# Altium footprint library Terra.PcbLib: 59 footprints (part 3 of 4)
Each footprint in its own frame and in the unit in brackets; x right, y up, seen from the top. Pads: shape width x height; smd on the part's side, far side on the other; paste and mask are expansions set on the pad; w line width, h text height; cw(c..) or ccw(c..) is an arc to the next point about the centre after c.
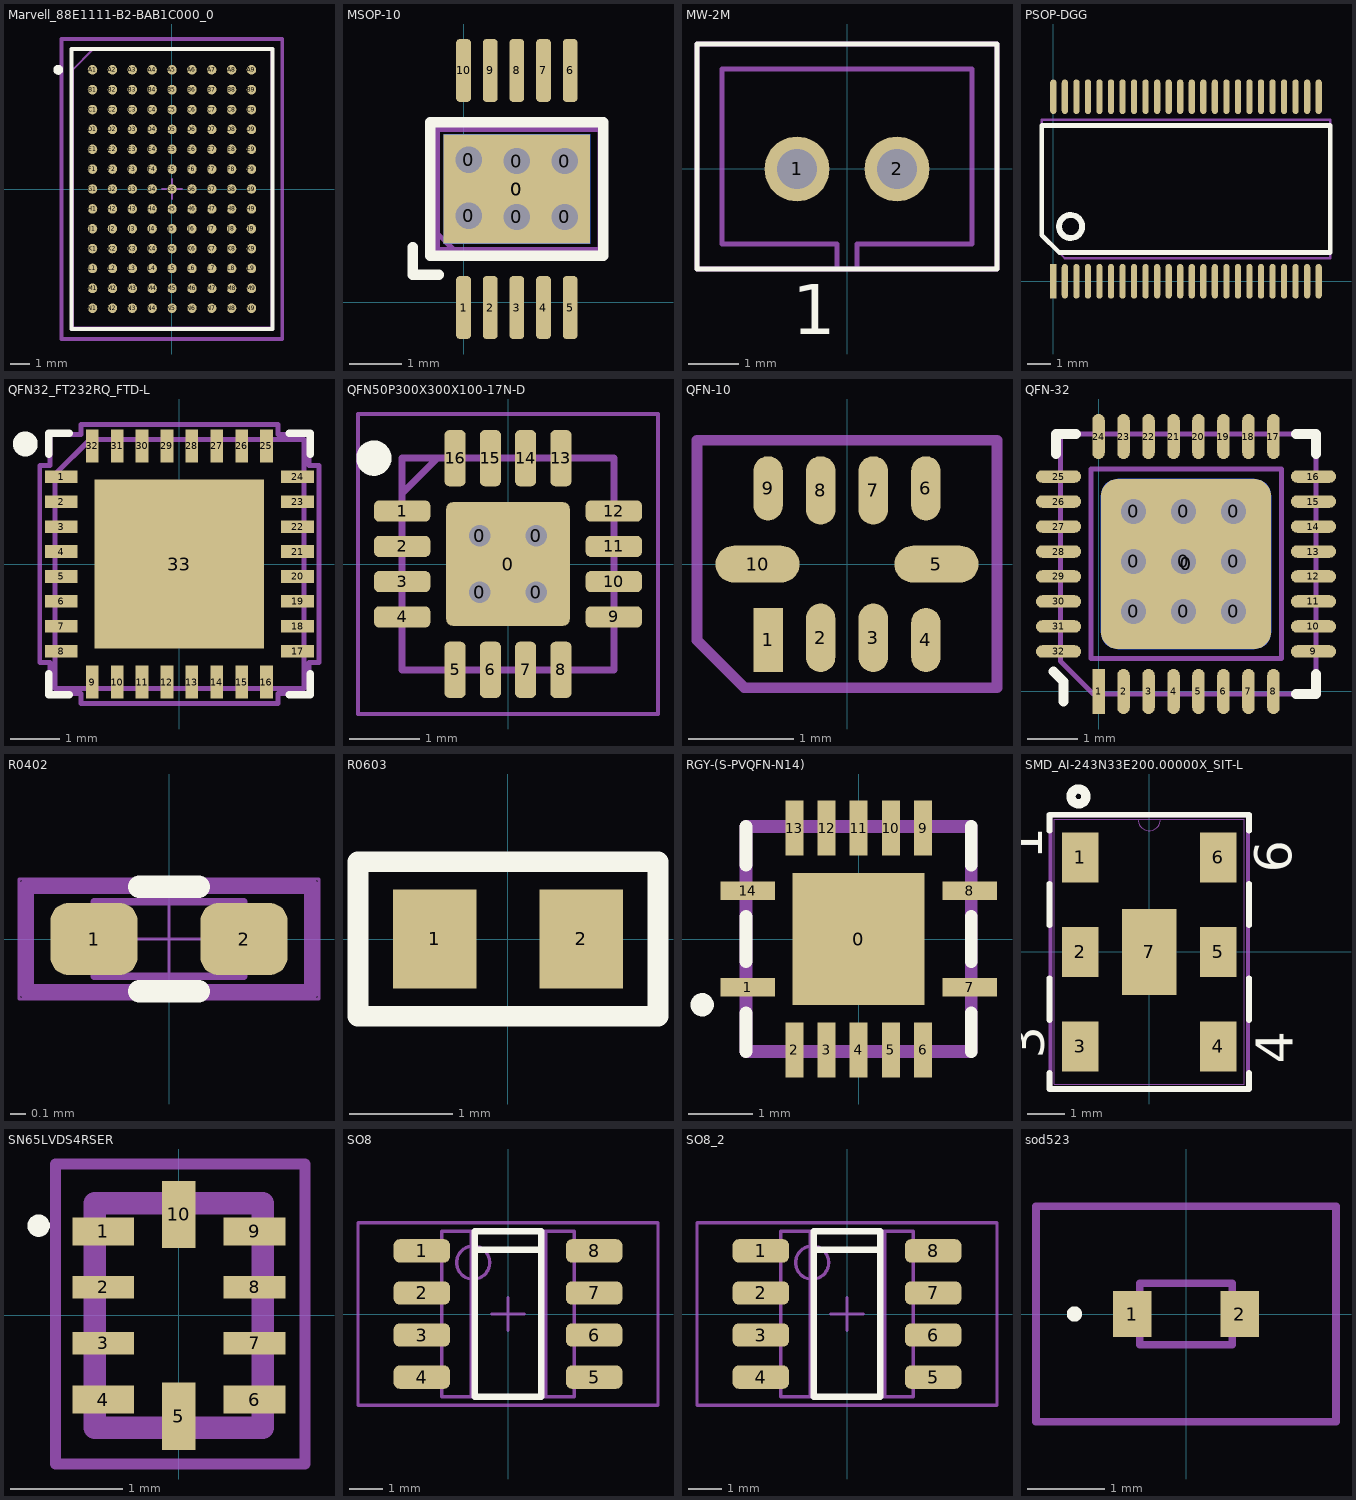
[diagram p2: the footprints below, top view; thin cyan lines are the x and y axes]

## Marvell_88E1111-B2-BAB1C000_0 [mm]
pads (117):
  round 0.48 smd paste+0 mask+0: A1(-4,6) A2(-3,6) A3(-2,6) A4(-1,6) A5(0,6) A6(1,6) A7(2,6) A8(3,6) A9(4,6) B1(-4,5) B2(-3,5) B3(-2,5) B4(-1,5) B5(0,5) B6(1,5) B7(2,5) B8(3,5) B9(4,5) C1(-4,4) C2(-3,4) C3(-2,4) C4(-1,4) C5(0,4) C6(1,4) C7(2,4) C8(3,4) C9(4,4) D1(-4,3) D2(-3,3) D3(-2,3) D4(-1,3) D5(0,3) D6(1,3) D7(2,3) D8(3,3) D9(4,3) E1(-4,2) E2(-3,2) E3(-2,2) E4(-1,2) E5(0,2) E6(1,2) E7(2,2) E8(3,2) E9(4,2) F1(-4,1) F2(-3,1) F3(-2,1) F4(-1,1) F5(0,1) F6(1,1) F7(2,1) F8(3,1) F9(4,1) G1(-4,0) G2(-3,0) G3(-2,0) G4(-1,0) G5(0,0) G6(1,0) G7(2,0) G8(3,0) G9(4,0) H1(-4,-1) H2(-3,-1) H3(-2,-1) H4(-1,-1) H5(0,-1) H6(1,-1) H7(2,-1) H8(3,-1) H9(4,-1) J1(-4,-2) J2(-3,-2) J3(-2,-2) J4(-1,-2) J5(0,-2) J6(1,-2) J7(2,-2) J8(3,-2) J9(4,-2) K1(-4,-3) K2(-3,-3) K3(-2,-3) K4(-1,-3) K5(0,-3) K6(1,-3) K7(2,-3) K8(3,-3) K9(4,-3) L1(-4,-4) L2(-3,-4) L3(-2,-4) L4(-1,-4) L5(0,-4) L6(1,-4) L7(2,-4) L8(3,-4) L9(4,-4) M1(-4,-5) M2(-3,-5) M3(-2,-5) M4(-1,-5) M5(0,-5) M6(1,-5) M7(2,-5) M8(3,-5) M9(4,-5) N1(-4,-6) N2(-3,-6) N3(-2,-6) N4(-1,-6) N5(0,-6) N6(1,-6) N7(2,-6) N8(3,-6) N9(4,-6)
Top Overlay:
  circle w0.25: c-5.725,6 r0.125
  lines w0.2: -5.05,-7.05 -5.05,7.05 5.05,7.05 5.05,-7.05 -5.05,-7.05
Mechanical 1:
  lines w0.1: -4.975,-6.975 5,-6.975 5,7 -4,7 -4.975,6.025 -4.975,-6.975
  text ".Designator" at -4.425,-0.525 h1.5
Mechanical 10:
  lines w0.2: -5.55,-7.55 -5.55,7.55 5.55,7.55 5.55,-7.55 -5.55,-7.55
  text ".Designator" at 0,0 h1
Mechanical 12:
  lines w0.15: -5.05,-7.05 -5.05,7.05 5.05,7.05 5.05,-7.05 -5.05,-7.05
Mechanical 15:
  lines w0.1: -0.5,0 0.5,0 ; 0,-0.5 0,0.5
  lines w0.2: -5.55,-7.55 -5.55,7.55 5.55,7.55 5.55,-7.55 -5.55,-7.55
3D body "IC_Marvell_88E1111-B2-BAB1C000_eec.STEP": height 1.52, standoff -0.02, extent -5,-7 5,7

## MSOP-10 [mm]
height 1.1
pads (18):
  round 0.8 hole 0.5: 0(0.102,1.651) 0(0.102,2.718) 0(1.016,1.626) 0(1.016,2.692) 0(1.93,1.626) 0(1.93,2.692)
  rect 2.794x2.083 smd mask+0.102: 0(1.016,2.159)
  rect 2.794x2.083 smd far side mask+0.102: 0(1.016,2.159)
  rrect50% 0.28x1.2 smd mask+0.102: 1(0,-0.1) 2(0.508,-0.1) 3(1.016,-0.1) 4(1.524,-0.1) 5(2.032,-0.1) 6(2.032,4.418) 7(1.524,4.418) 8(1.016,4.418) 9(0.508,4.418) 10(0,4.418)
Top Overlay:
  lines w0.2: -0.972,1.05 -0.972,0.525 -0.475,0.525 ; -0.635,0.889 -0.635,3.429 2.667,3.429 2.667,0.889 -0.635,0.889
Mechanical 1:
  lines w0.1: -0.635,1.448 -0.635,3.429 2.667,3.429 2.667,0.889 -0.076,0.889 -0.635,1.448
  text ".Designator" at -0.33,1.88 h0.8
Mechanical 2:
  lines w0.1: -0.5,1 -0.5,3.3 2.6,3.3 2.6,1 -0.5,1
3D body "User Library-msop-10.STEP": height 1.15, standoff 0, extent -0.485,-0.317 2.515,4.584

## MW-2M [mm] "Разъем питания 2 конт.(п) шаг 2,00 на плату"
height 6
pads (2):
  round 1.3 hole 0.8: 1(-1,0) 2(1,0)
Top Overlay:
  lines w0.1: -3,-2 -3,2.5 3,2.5 3,-2 -3,-2
  text "1" at -1.1,-3.3 h1
Mechanical 1:
  lines w0.1: -0.2,-2 -0.2,-1.5 -2.5,-1.5 -2.5,2 2.5,2 2.5,-1.5 0.2,-1.5 0.2,-2 ; -3,-2 3,-2 3,2.5 -3,2.5 -3,-2
  text "2" at 1.4,0.7 h1
  text ".Designator" at -1.8,3 h1
  text "1" at -2,0.7 h1
3D body: height 6, standoff 0, extent 0.751,-0.249 1.25,0.25
3D body: height 6, standoff 0, extent -1.249,-0.249 -0.751,0.249
3D body: height 6, standoff 0, extent -2.999,-1.999 2.999,2.499
3D body: height 1, standoff 0, extent -2.999,-1.999 2.999,2.499

## PSOP-DGG [mm]
height 1.2
pads (48):
  rect 0.27x1.5 smd: 1(0,0)
  oval 0.27x1.5 smd: 2(0.5,0) 3(1,0) 4(1.5,0) 5(2,0) 6(2.5,0) 7(3,0) 8(3.5,0) 9(4,0) 10(4.5,0) 11(5,0) 12(5.5,0) 13(6,0) 14(6.5,0) 15(7,0) 16(7.5,0) 17(8,0) 18(8.5,0) 19(9,0) 20(9.5,0) 21(10,0) 22(10.5,0) 23(11,0) 24(11.5,0) 25(11.5,8) 26(11,8) 27(10.5,8) 28(10,8) 29(9.5,8) 30(9,8) 31(8.5,8) 32(8,8) 33(7.5,8) 34(7,8) 35(6.5,8) 36(6,8) 37(5.5,8) 38(5,8) 39(4.5,8) 40(4,8) 41(3.5,8) 42(3,8) 43(2.5,8) 44(2,8) 45(1.5,8) 46(1,8) 47(0.5,8) 48(0,8)
Top Overlay:
  circle w0.254: c0.75,2.375 r0.5
  lines w0.2: -0.5,2 -0.5,6.75 12,6.75 12,1.25 0.25,1.25 -0.5,2
Mechanical 1:
  lines w0.1: -0.5,2 -0.5,7 12,7 12,1 0.5,1 -0.5,2
  text ".Designator" at 1.5,3.5 h1.3

## QFN32_FT232RQ_FTD-L [mil]
pads (33):
  rect 26x10 smd paste+0 mask+0: 1(-93.5,68.92) 2(-93.5,49.23) 3(-93.5,29.54) 4(-93.5,9.85) 5(-93.5,-9.85) 6(-93.5,-29.54) 7(-93.5,-49.23) 8(-93.5,-68.92) 17(93.5,-68.92) 18(93.5,-49.23) 19(93.5,-29.54) 20(93.5,-9.85) 21(93.5,9.85) 22(93.5,29.54) 23(93.5,49.23) 24(93.5,68.92)
  rect 10x26 smd paste+0 mask+0: 9(-68.92,-93.5) 10(-49.23,-93.5) 11(-29.54,-93.5) 12(-9.85,-93.5) 13(9.85,-93.5) 14(29.54,-93.5) 15(49.23,-93.5) 16(68.92,-93.5) 25(68.92,93.5) 26(49.23,93.5) 27(29.54,93.5) 28(9.85,93.5) 29(-9.85,93.5) 30(-29.54,93.5) 31(-49.23,93.5) 32(-68.92,93.5)
  rect 134x134 smd paste-67 mask+0: 33(0,0)
Top Overlay:
  circle w9.84: c-122,95 r4.92
  lines w6: -103.5,-87.02 -103.5,-103.5 -87.02,-103.5 ; -103.5,87.02 -103.5,103.5 -87.02,103.5 ; 87.02,-103.5 103.5,-103.5 103.5,-87.02 ; 87.02,103.5 103.5,103.5 103.5,87.02
Top Paste:
  region: -3.94,63.06 -63.06,63.06 -63.06,3.94 -3.94,3.94
  region: -3.94,-3.94 -63.06,-3.94 -63.06,-63.06 -3.94,-63.06
  region: 63.06,63.06 3.94,63.06 3.94,3.94 63.06,3.94
  region: 63.06,-3.94 3.94,-3.94 3.94,-63.06 63.06,-63.06
Mechanical 1:
  lines w3.94: -98.5,-98.5 98.5,-98.5 98.5,98.5 -70.79,98.5 -98.5,70.79 -98.5,-98.5
  text ".Designator" at -84.86,-16.98 h51.18
Mechanical 13:
  lines w1: -98.5,-74.92 -98.5,-62.91 -98.5,-74.92 ; -98.5,-55.23 -98.5,-43.23 -98.5,-55.23 ; -98.5,-35.53 -98.5,-23.54 -98.5,-35.53 ; -98.5,-15.85 -98.5,-3.85 -98.5,-15.85 ; -98.5,3.85 -98.5,15.85 -98.5,3.85 ; -98.5,23.54 -98.5,35.53 -98.5,23.54 ; -98.5,43.23 -98.5,55.23 -98.5,43.23 ; -74.92,-98.5 -62.91,-98.5 -74.92,-98.5 ; -55.23,-98.5 -43.23,-98.5 -55.23,-98.5 ; -55.23,98.5 -43.23,98.5 -55.23,98.5 ; -35.53,-98.5 -23.54,-98.5 -35.53,-98.5 ; -35.53,98.5 -23.54,98.5 -35.53,98.5 ; -15.85,-98.5 -3.85,-98.5 -15.85,-98.5 ; -15.85,98.5 -3.85,98.5 -15.85,98.5 ; 3.85,-98.5 15.85,-98.5 3.85,-98.5 ; 3.85,98.5 15.85,98.5 3.85,98.5 ; 23.54,-98.5 35.53,-98.5 23.54,-98.5 ; 23.54,98.5 35.53,98.5 23.54,98.5 ; 43.23,-98.5 55.23,-98.5 43.23,-98.5 ; 43.23,98.5 55.23,98.5 43.23,98.5 ; 62.91,-98.5 74.92,-98.5 62.91,-98.5 ; 62.91,98.5 74.92,98.5 62.91,98.5 ; 98.5,-74.92 98.5,-62.91 98.5,-74.92 ; 98.5,-55.23 98.5,-43.23 98.5,-55.23 ; 98.5,-35.53 98.5,-23.54 98.5,-35.53 ; 98.5,-15.85 98.5,-3.85 98.5,-15.85 ; 98.5,3.85 98.5,15.85 98.5,3.85 ; 98.5,23.54 98.5,35.53 98.5,23.54 ; 98.5,43.23 98.5,55.23 98.5,43.23 ; 98.5,62.91 98.5,74.92 98.5,62.91
Mechanical 15:
  lines w3.94: -110.5,-77.92 -102.5,-77.92 -102.5,-102.5 -77.92,-102.5 -77.92,-110.5 77.92,-110.5 77.92,-102.5 102.5,-102.5 102.5,-77.92 110.5,-77.92 110.5,77.92 102.5,77.92 102.5,102.5 77.92,102.5 77.92,110.5 -77.92,110.5 -77.92,102.5 -102.5,102.5 -102.5,77.92 -110.5,77.92 -110.5,-77.92
3D body "QFN32_FT232RQ_FTD.step": height 35.12, standoff 0, extent -98.5,-98.5 98.51,98.51

## QFN50P300X300X100-17N-D [mm]
pads (21):
  round 0.7 hole 0.3: 0(-0.4,-0.4) 0(-0.4,0.4) 0(0.4,-0.4) 0(0.4,0.4)
  rrect10% 1.75x1.75 smd: 0(0,0)
  rrect50% 0.8x0.3 smd: 1(-1.5,0.75) 2(-1.5,0.25) 3(-1.5,-0.25) 4(-1.5,-0.75) 9(1.5,-0.75) 10(1.5,-0.25) 11(1.5,0.25) 12(1.5,0.75)
  rrect50% 0.3x0.8 smd: 5(-0.75,-1.5) 6(-0.25,-1.5) 7(0.25,-1.5) 8(0.75,-1.5) 13(0.75,1.5) 14(0.25,1.5) 15(-0.25,1.5) 16(-0.75,1.5)
Top Overlay:
  circle w0.25: c-1.9,1.5 r0.125
Mechanical 13:
  lines w0.1: -1.5,1 -1,1.5 ; -1.5,-1.5 1.5,-1.5 1.5,1.5 -1.5,1.5 -1.5,-1.5
Mechanical 15:
  lines w0.05: -2.125,-2.125 2.125,-2.125 2.125,2.125 -2.125,2.125 -2.125,-2.125
3D body "TLV62130RGTR.stp": height 1, standoff 0, extent -1.5,-1.5 1.5,1.5

## QFN-10 [mm]
pads (10):
  rect 0.28x0.61 smd mask+0.1: 1(-0.75,-0.72)
  oval 0.28x0.65 smd mask+0.1: 2(-0.25,-0.7) 3(0.25,-0.7) 7(0.25,0.7) 8(-0.25,0.7)
  oval 0.28x0.61 smd mask+0.1: 4(0.75,-0.72) 6(0.75,0.72) 9(-0.75,0.72)
  oval 0.8x0.35 smd paste+0.002 mask+0.1: 5(0.85,0) 10(-0.85,0)
Mechanical 1:
  lines w0.1: -1.425,-0.723 -0.975,-1.172 1.425,-1.172 1.425,1.175 -1.425,1.175 -1.425,-0.723
  text ".Designator" at -1.15,-0.325 h0.8

## QFN-32 [mm] "12"
height 1
pads (43):
  round 0.9 hole 0.5: 0(0.7,1.6) 0(0.7,2.6) 0(0.7,3.6) 0(1.7,1.6) 0(1.7,2.6) 0(1.7,3.6) 0(2.7,1.6) 0(2.7,2.6) 0(2.7,3.6)
  rrect20% 3.399x3.399 smd mask+0.101: 0(1.748,2.548)
  rrect20% 3.399x3.399 smd far side mask+0.101: 0(1.748,2.548)
  rect 0.25x0.9 smd mask+0.1: 1(0,0)
  oval 0.25x0.9 smd mask+0.1: 2(0.5,0) 3(0.999,0) 4(1.499,0) 5(1.998,0) 6(2.498,0) 7(2.997,0) 8(3.497,0) 17(3.497,5.095) 18(2.997,5.095) 19(2.498,5.095) 20(1.998,5.095) 21(1.499,5.095) 22(0.999,5.095) 23(0.5,5.095) 24(0,5.095)
  oval 0.9x0.25 smd paste+0.002 mask+0.1: 9(4.296,0.799) 10(4.296,1.299) 11(4.296,1.798) 12(4.296,2.298) 13(4.296,2.797) 14(4.296,3.297) 15(4.296,3.796) 16(4.296,4.296) 25(-0.799,4.296) 26(-0.799,3.796) 27(-0.799,3.297) 28(-0.799,2.797) 29(-0.799,2.298) 30(-0.799,1.798) 31(-0.799,1.299) 32(-0.799,0.799)
Top Overlay:
  lines w0.2: -0.899,0.4 -0.699,0.2 -0.699,-0.2 ; -0.849,4.746 -0.849,5.145 -0.45,5.145 ; 3.946,-0.05 4.346,-0.05 4.346,0.35 ; 3.946,5.145 4.346,5.145 4.346,4.746
Mechanical 1:
  lines w0.1: 4.343,5.145 -0.762,5.145 -0.762,0.61 -0.102,-0.05 4.346,-0.05 4.346,5.145
  text ".Designator" at -0.127,2.235 h1
Mechanical 2:
  lines w0.1: -0.152,0.66 -0.152,4.445 3.658,4.445 3.658,0.66 -0.152,0.66
3D body "SW3dPS-QFN32.STEP": height 0.73, standoff -0.02, extent -0.755,0.06 4.245,5.065

## R0402 [mm] "Chip Resistor 1.0x0.5mm"
height 0.4
pads (2):
  rrect50% 0.58x0.48 smd: 1(-0.5,0) 2(0.5,0)
Top Overlay:
  lines w0.15: -0.2,-0.35 0.2,-0.35 ; -0.2,0.35 0.2,0.35
Mechanical 1:
  lines w0.1: -0.95,-0.35 -0.95,0.35 0.95,0.35 0.95,-0.35 -0.95,-0.35
  text ".Designator" at -0.8,-0.2 h0.4
Mechanical 13:
  lines w0.05: -0.5,-0.25 0.5,-0.25 0.5,0.25 -0.5,0.25 -0.5,-0.25
Mechanical 15:
  lines w0.02: -0.3,0 0.3,0 ; 0,-0.3 0,0.3 ; -1,-0.4 1,-0.4 1,0.4 -1,0.4 -1,-0.4
3D body "res_0402_10x05x04.STEP": height 0.4, standoff 0, extent -0.5,-0.25 0.5,0.25

## R0603 [mil]
pads (2):
  rect 32x38 smd: 1(-27.99,0) 2(28.01,0)
Top Overlay:
  lines w7.87: -57.49,-29.53 57.51,-29.53 57.51,29.53 -57.49,29.53 -57.49,-29.53
Mechanical 1:
  lines w3.94: -57.49,-28.54 57.51,-28.54 57.51,28.54 -57.49,28.54 -57.49,-28.54
  text ".Designator" at -52,-16 h31.5
3D body "SW3dPS-0603 SMD Resistor.STEP": height 11.89, standoff 0, extent -30.49,-16.49 32.51,15

## RGY-(S-PVQFN-N14) [mm]
pads (15):
  rect 2.05x2.05 smd: 0(0,0)
  rect 0.85x0.28 smd: 1(-1.725,-0.75) 7(1.725,-0.75) 8(1.725,0.75) 14(-1.725,0.75)
  rect 0.28x0.85 smd: 2(-1,-1.725) 3(-0.5,-1.725) 4(0,-1.725) 5(0.5,-1.725) 6(1,-1.725) 9(1,1.725) 10(0.5,1.725) 11(0,1.725) 12(-0.5,1.725) 13(-1,1.725)
Top Overlay:
  circle w0.2: c-2.432,-1.022 r0.081
  lines w0.2: -1.75,-1.75 -1.75,-1.15 ; -1.75,-0.35 -1.75,0.35 ; -1.75,1.15 -1.75,1.75 ; 1.75,-1.75 1.75,-1.15 ; 1.75,-0.35 1.75,0.35 ; 1.75,1.15 1.75,1.75
Mechanical 13:
  lines w0.2: -1.75,-1.75 1.75,-1.75 1.75,1.75 -1.75,1.75 -1.75,-1.75
3D body "TPS54620RGYT.stp": height 0.97, standoff 0, extent -1.75,-1.75 1.75,1.75

## SMD_AI-243N33E200.00000X_SIT-L [mil]
pads (7):
  rect 39x53 smd paste+0 mask+0: 1(-72.99,100) 2(-72.99,0) 3(-72.99,-100) 4(72.99,-100) 5(72.99,0) 6(72.99,100)
  rect 58x91 smd paste+0 mask+0: 7(0,0)
Top Overlay:
  circle w9.84: c-74.8,164.37 r7.87
  lines w6: -105.5,-128.02 -105.5,-145 105.5,-145 105.5,-128.02 ; -105.5,-71.98 -105.5,-28.02 ; -105.5,28.02 -105.5,71.98 ; -105.5,128.02 -105.5,145 105.5,145 105.5,128.02 ; 105.5,-71.98 105.5,-28.02 ; 105.5,28.02 105.5,71.98
  text "6" at 150.59,83.66 h39.37
  text "1" at -113.19,97.44 h39.37
  text "4" at 151.57,-118.11 h39.37
  text "3" at -111.22,-113.19 h39.37
Mechanical 13:
  lines w0: -12,140 ccw(c0,140) 12,140
  lines w1: -100.5,-140 100.5,-140 100.5,140 -100.5,140 -100.5,-140
Mechanical 15:
  lines w3.94: -104.5,-144 104.5,-144 104.5,-130.5 104.5,130.5 104.5,144 -104.5,144 -104.5,130.5 -104.5,-130.5 -104.5,-144
3D body: height 10, standoff 0, extent 0,0 10,10

## SN65LVDS4RSER [mm]
pads (10):
  rect 0.55x0.25 smd: 1(-0.675,0.75) 4(-0.675,-0.75) 6(0.675,-0.75) 9(0.675,0.75)
  rect 0.55x0.2 smd: 2(-0.675,0.25) 3(-0.675,-0.25) 7(0.675,-0.25) 8(0.675,0.25)
  rect 0.3x0.6 smd: 5(0,-0.9) 10(0,0.9)
Top Overlay:
  lines w0.1: -1.3,0.8 ccw(c-1.25,0.8) -1.2,0.8 ccw(c-1.25,0.8) -1.3,0.8
Mechanical 13:
  lines w0.2: -0.75,-1 0.75,-1 0.75,1 -0.75,1 -0.75,-1
Mechanical 15:
  lines w0.1: -1.1,-1.325 1.125,-1.325 1.125,1.35 -1.1,1.35 -1.1,-1.325
3D body "SN65LVDS4RSER.stp": height 0.6, standoff 0, extent -0.75,-1 0.75,1

## SO8 [mm] "SOIC, 8-Leads, Body 5,0x4,0mm (max), Pitch 1,27mm"
height 2.65
pads (8):
  rrect50% 1.7x0.7 smd: 1(-2.6,1.905) 2(-2.6,0.635) 3(-2.6,-0.635) 4(-2.6,-1.905) 5(2.6,-1.905) 6(2.6,-0.635) 7(2.6,0.635) 8(2.6,1.905)
Top Overlay:
  lines w0.2: -1,1.941 1,1.941 ; -1,-2.5 1,-2.5 1,2.5 -1,2.5 -1,-2.5
Mechanical 1:
  lines w0.1: -1.118,1.941 1.143,1.941 ; -1.118,-2.5 -1.118,2.5 1.143,2.5 1.143,-2.5 -1.118,-2.5
  text ".Designator" at 0.4,-1.25 h0.8
Mechanical 13:
  circle w0.1: c-1.05,1.55 r0.5
  lines w0.1: -2,-2.5 2,-2.5 2,2.5 -2,2.5 -2,-2.5
Mechanical 15:
  lines w0.1: -0.5,0 0.5,0 ; 0,-0.5 0,0.5 ; -4.525,-2.75 4.525,-2.75 4.525,2.75 -4.525,2.75 -4.525,-2.75
3D body "SW3dPS-SOIC08-150.STEP": height 1.75, standoff 0, extent -2.825,-2.4 2.975,2.4

## SO8_2 [mm]
pads (8):
  rrect50% 1.7x0.7 smd: 1(-2.6,1.905) 2(-2.6,0.635) 3(-2.6,-0.635) 4(-2.6,-1.905) 5(2.6,-1.905) 6(2.6,-0.635) 7(2.6,0.635) 8(2.6,1.905)
Top Overlay:
  lines w0.2: -1,1.941 1,1.941 ; -1,-2.5 -1,2.5 1,2.5 1,-2.5 -1,-2.5
Mechanical 1:
  lines w0.1: -1.118,1.941 1.143,1.941 ; -1.118,-2.5 1.143,-2.5 1.143,2.5 -1.118,2.5 -1.118,-2.5
  text ".Designator" at 0.4,-1.25 h0.8
Mechanical 13:
  circle w0.1: c-1.05,1.55 r0.5
  lines w0.1: -2,-2.5 -2,2.5 2,2.5 2,-2.5 -2,-2.5
Mechanical 15:
  lines w0.1: -0.5,0 0.5,0 ; 0,-0.5 0,0.5 ; -4.525,-2.75 -4.525,2.75 4.525,2.75 4.525,-2.75 -4.525,-2.75
3D body "SW3dPS-SOIC08-150.STEP": height 1.75, standoff 0, extent -2.825,-2.4 2.975,2.4

## sod523 [mm]
pads (2):
  rect 0.5x0.6 smd: 1(-0.7,0) 2(0.7,0)
Top Overlay:
  lines w0.1: -1.5,0 ccw(c-1.45,0) -1.4,0 ccw(c-1.45,0) -1.5,0
Mechanical 13:
  lines w0.1: -0.6,-0.4 -0.6,0.4 0.6,0.4 0.6,-0.4 -0.6,-0.4
Mechanical 15:
  lines w0.1: -1.95,-1.4 -1.95,1.4 1.95,1.4 1.95,-1.4 -1.95,-1.4
3D body "1PS79SB30YL.stp": height 0.53, standoff -0.08, extent -0.8,-0.455 0.8,0.375